# Altium schematic symbol library jlcpcb_2025_04_resistors_extended_2512.schlib: 2667 symbols (part 9 of 14) (continued)
## PE2512FKE7W0R04L
designator R?  Resistance: 40mΩ  (hidden comment: *)
Resistor, 40mΩ, ±1%, 2W, ±50ppm/℃, -55℃~+170℃, SMD 2512; Manufacturer: Uniroyal; Manufacturer Part Number: PE2512FKE7W0R04L; Supplier 1: LCSC; Supplier Part Number 1: C875729; JLCPCB Part Number: C875729; Power Rating: 2W; Category: Resistors; Package Size: 2512; JLCPCB Basic Part: Yes; Tolerance: ±1%; Temperature Coefficient: ±50ppm/℃; Temperature Rating: -55℃~+170℃; ComponentLink1Description: Datasheet; ComponentLink1URL: https://wmsc.lcsc.com/wmsc/upload/file/pdf/v2/lcsc/2104021442_YAGEO-PE2512FKE7W0R04L_C875729.pdf; ComponentLink2Description: JLCPCB Part URL; ComponentLink2URL: https://jlcpcb.com/partdetail/C875729
pins: 1, 2
1 alternate drawing of the same symbol

## PE2512FKE7W0R006L
designator R?  Resistance: 6mΩ  (hidden comment: *)
Resistor, 6mΩ, ±1%, 2W, ±50ppm/℃, -55℃~+170℃, SMD 2512; Manufacturer: Uniroyal; Manufacturer Part Number: PE2512FKE7W0R006L; Supplier 1: LCSC; Supplier Part Number 1: C2075798; JLCPCB Part Number: C2075798; Power Rating: 2W; Category: Resistors; Package Size: 2512; JLCPCB Basic Part: Yes; Tolerance: ±1%; Temperature Coefficient: ±50ppm/℃; Temperature Rating: -55℃~+170℃; ComponentLink1Description: Datasheet; ComponentLink1URL: https://wmsc.lcsc.com/wmsc/upload/file/pdf/v2/lcsc/2311211101_YAGEO-PE2512FKE7W0R006L_C2075798.pdf; ComponentLink2Description: JLCPCB Part URL; ComponentLink2URL: https://jlcpcb.com/partdetail/C2075798
pins: 1, 2
1 alternate drawing of the same symbol

## PE2512FKE7W0R06L
designator R?  Resistance: 60mΩ  (hidden comment: *)
Resistor, 60mΩ, ±1%, 2W, ±50ppm/℃, -55℃~+170℃, SMD 2512; Manufacturer: Uniroyal; Manufacturer Part Number: PE2512FKE7W0R06L; Supplier 1: LCSC; Supplier Part Number 1: C875732; JLCPCB Part Number: C875732; Power Rating: 2W; Category: Resistors; Package Size: 2512; JLCPCB Basic Part: Yes; Tolerance: ±1%; Temperature Coefficient: ±50ppm/℃; Temperature Rating: -55℃~+170℃; ComponentLink1Description: Datasheet; ComponentLink1URL: https://wmsc.lcsc.com/wmsc/upload/file/pdf/v2/lcsc/2311211101_YAGEO-PE2512FKE7W0R06L_C875732.pdf; ComponentLink2Description: JLCPCB Part URL; ComponentLink2URL: https://jlcpcb.com/partdetail/C875732
pins: 1, 2
1 alternate drawing of the same symbol

## PE2512FKE7W0R012L
designator R?  Resistance: 12mΩ  (hidden comment: *)
Resistor, 12mΩ, ±1%, 2W, ±50ppm/℃, -55℃~+170℃, SMD 2512; Manufacturer: Uniroyal; Manufacturer Part Number: PE2512FKE7W0R012L; Supplier 1: LCSC; Supplier Part Number 1: C875718; JLCPCB Part Number: C875718; Power Rating: 2W; Category: Resistors; Package Size: 2512; JLCPCB Basic Part: Yes; Tolerance: ±1%; Temperature Coefficient: ±50ppm/℃; Temperature Rating: -55℃~+170℃; ComponentLink1Description: Datasheet; ComponentLink1URL: https://wmsc.lcsc.com/wmsc/upload/file/pdf/v2/lcsc/2311211101_YAGEO-PE2512FKE7W0R012L_C875718.pdf; ComponentLink2Description: JLCPCB Part URL; ComponentLink2URL: https://jlcpcb.com/partdetail/C875718
pins: 1, 2
1 alternate drawing of the same symbol

## PE2512FKE7W0R018L
designator R?  Resistance: 18mΩ  (hidden comment: *)
Resistor, 18mΩ, ±1%, 2W, ±50ppm/℃, -55℃~+170℃, SMD 2512; Manufacturer: Uniroyal; Manufacturer Part Number: PE2512FKE7W0R018L; Supplier 1: LCSC; Supplier Part Number 1: C875719; JLCPCB Part Number: C875719; Power Rating: 2W; Category: Resistors; Package Size: 2512; JLCPCB Basic Part: Yes; Tolerance: ±1%; Temperature Coefficient: ±50ppm/℃; Temperature Rating: -55℃~+170℃; ComponentLink1Description: Datasheet; ComponentLink1URL: https://wmsc.lcsc.com/wmsc/upload/file/pdf/v2/lcsc/2111120930_YAGEO-PE2512FKE7W0R018L_C875719.pdf; ComponentLink2Description: JLCPCB Part URL; ComponentLink2URL: https://jlcpcb.com/partdetail/C875719
pins: 1, 2
1 alternate drawing of the same symbol

## PE2512FKE070R01L
designator R?  Resistance: 10mΩ  (hidden comment: *)
Resistor, 10mΩ, ±1%, 1W, ±50ppm/℃, -55℃~+170℃, SMD 2512; Manufacturer: Uniroyal; Manufacturer Part Number: PE2512FKE070R01L; Supplier 1: LCSC; Supplier Part Number 1: C2093321; JLCPCB Part Number: C2093321; Power Rating: 1W; Category: Resistors; Package Size: 2512; JLCPCB Basic Part: Yes; Tolerance: ±1%; Temperature Coefficient: ±50ppm/℃; Temperature Rating: -55℃~+170℃; ComponentLink1Description: Datasheet; ComponentLink1URL: https://wmsc.lcsc.com/wmsc/upload/file/pdf/v2/lcsc/2311211101_YAGEO-PE2512FKE070R01L_C2093321.pdf; ComponentLink2Description: JLCPCB Part URL; ComponentLink2URL: https://jlcpcb.com/partdetail/C2093321
pins: 1, 2
1 alternate drawing of the same symbol

## PE2512FKE070R03L
designator R?  Resistance: 30mΩ  (hidden comment: *)
Resistor, 30mΩ, ±1%, 1W, ±50ppm/℃, -55℃~+170℃, SMD 2512; Manufacturer: Uniroyal; Manufacturer Part Number: PE2512FKE070R03L; Supplier 1: LCSC; Supplier Part Number 1: C4139521; JLCPCB Part Number: C4139521; Power Rating: 1W; Category: Resistors; Package Size: 2512; JLCPCB Basic Part: Yes; Tolerance: ±1%; Temperature Coefficient: ±50ppm/℃; Temperature Rating: -55℃~+170℃; ComponentLink1Description: Datasheet; ComponentLink1URL: https://wmsc.lcsc.com/wmsc/upload/file/pdf/v2/lcsc/2311211101_YAGEO-PE2512FKE070R03L_C4139521.pdf; ComponentLink2Description: JLCPCB Part URL; ComponentLink2URL: https://jlcpcb.com/partdetail/C4139521
pins: 1, 2
1 alternate drawing of the same symbol

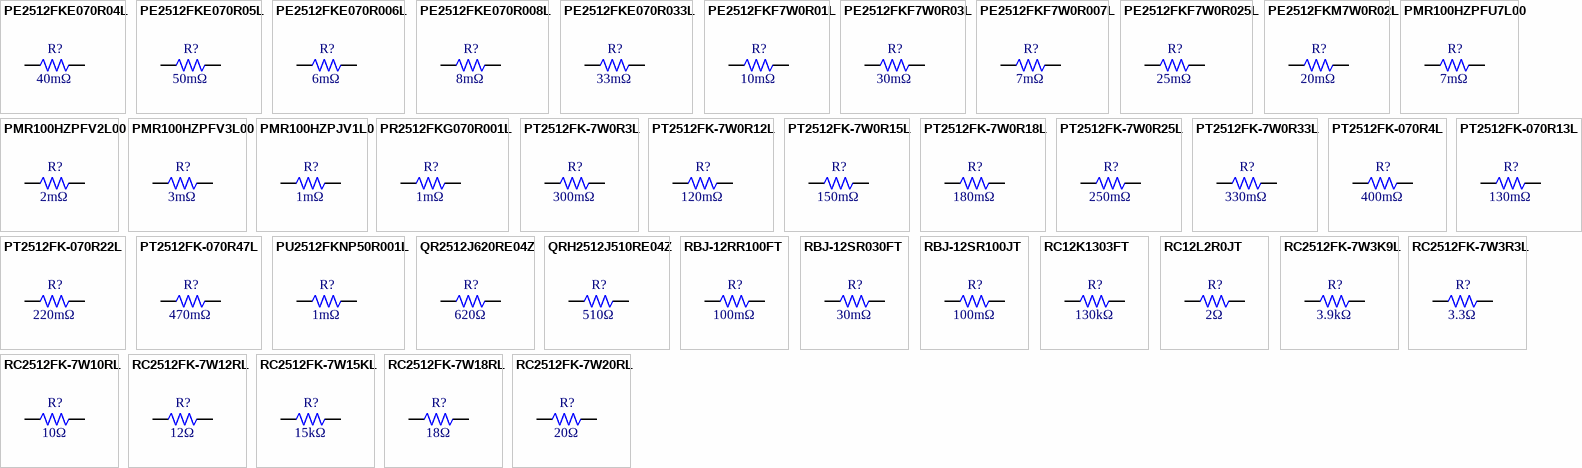
[diagram p41: symbols PE2512FKE070R04L to RC2512FK-7W20RL]

## PE2512FKE070R04L
designator R?  Resistance: 40mΩ  (hidden comment: *)
Resistor, 40mΩ, ±1%, 1W, ±50ppm/℃, -55℃~+170℃, SMD 2512; Manufacturer: Uniroyal; Manufacturer Part Number: PE2512FKE070R04L; Supplier 1: LCSC; Supplier Part Number 1: C2075347; JLCPCB Part Number: C2075347; Power Rating: 1W; Category: Resistors; Package Size: 2512; JLCPCB Basic Part: Yes; Tolerance: ±1%; Temperature Coefficient: ±50ppm/℃; Temperature Rating: -55℃~+170℃; ComponentLink1Description: Datasheet; ComponentLink1URL: https://wmsc.lcsc.com/wmsc/upload/file/pdf/v2/lcsc/2311211101_YAGEO-PE2512FKE070R04L_C2075347.pdf; ComponentLink2Description: JLCPCB Part URL; ComponentLink2URL: https://jlcpcb.com/partdetail/C2075347
pins: 1, 2
1 alternate drawing of the same symbol

## PE2512FKE070R05L
designator R?  Resistance: 50mΩ  (hidden comment: *)
Resistor, 50mΩ, ±1%, 1W, ±50ppm/℃, -55℃~+170℃, SMD 2512; Manufacturer: Uniroyal; Manufacturer Part Number: PE2512FKE070R05L; Supplier 1: LCSC; Supplier Part Number 1: C2073413; JLCPCB Part Number: C2073413; Power Rating: 1W; Category: Resistors; Package Size: 2512; JLCPCB Basic Part: Yes; Tolerance: ±1%; Temperature Coefficient: ±50ppm/℃; Temperature Rating: -55℃~+170℃; ComponentLink1Description: Datasheet; ComponentLink1URL: https://wmsc.lcsc.com/wmsc/upload/file/pdf/v2/lcsc/2311211101_YAGEO-PE2512FKE070R05L_C2073413.pdf; ComponentLink2Description: JLCPCB Part URL; ComponentLink2URL: https://jlcpcb.com/partdetail/C2073413
pins: 1, 2
1 alternate drawing of the same symbol

## PE2512FKE070R006L
designator R?  Resistance: 6mΩ  (hidden comment: *)
Resistor, 6mΩ, ±1%, 1W, ±50ppm/℃, -55℃~+170℃, SMD 2512; Manufacturer: Uniroyal; Manufacturer Part Number: PE2512FKE070R006L; Supplier 1: LCSC; Supplier Part Number 1: C2075576; JLCPCB Part Number: C2075576; Power Rating: 1W; Category: Resistors; Package Size: 2512; JLCPCB Basic Part: Yes; Tolerance: ±1%; Temperature Coefficient: ±50ppm/℃; Temperature Rating: -55℃~+170℃; ComponentLink1Description: Datasheet; ComponentLink1URL: https://wmsc.lcsc.com/wmsc/upload/file/pdf/v2/lcsc/2311211101_YAGEO-PE2512FKE070R006L_C2075576.pdf; ComponentLink2Description: JLCPCB Part URL; ComponentLink2URL: https://jlcpcb.com/partdetail/C2075576
pins: 1, 2
1 alternate drawing of the same symbol

## PE2512FKE070R008L
designator R?  Resistance: 8mΩ  (hidden comment: *)
Resistor, 8mΩ, ±1%, 1W, ±50ppm/℃, -55℃~+170℃, SMD 2512; Manufacturer: Uniroyal; Manufacturer Part Number: PE2512FKE070R008L; Supplier 1: LCSC; Supplier Part Number 1: C2075410; JLCPCB Part Number: C2075410; Power Rating: 1W; Category: Resistors; Package Size: 2512; JLCPCB Basic Part: Yes; Tolerance: ±1%; Temperature Coefficient: ±50ppm/℃; Temperature Rating: -55℃~+170℃; ComponentLink1Description: Datasheet; ComponentLink1URL: https://wmsc.lcsc.com/wmsc/upload/file/pdf/v2/lcsc/2311211101_YAGEO-PE2512FKE070R008L_C2075410.pdf; ComponentLink2Description: JLCPCB Part URL; ComponentLink2URL: https://jlcpcb.com/partdetail/C2075410
pins: 1, 2
1 alternate drawing of the same symbol

## PE2512FKE070R033L
designator R?  Resistance: 33mΩ  (hidden comment: *)
Resistor, 33mΩ, ±1%, 1W, ±50ppm/℃, -55℃~+170℃, SMD 2512; Manufacturer: Uniroyal; Manufacturer Part Number: PE2512FKE070R033L; Supplier 1: LCSC; Supplier Part Number 1: C4191844; JLCPCB Part Number: C4191844; Power Rating: 1W; Category: Resistors; Package Size: 2512; JLCPCB Basic Part: Yes; Tolerance: ±1%; Temperature Coefficient: ±50ppm/℃; Temperature Rating: -55℃~+170℃; ComponentLink1Description: Datasheet; ComponentLink1URL: https://wmsc.lcsc.com/wmsc/upload/file/pdf/v2/lcsc/2311211101_YAGEO-PE2512FKE070R033L_C4191844.pdf; ComponentLink2Description: JLCPCB Part URL; ComponentLink2URL: https://jlcpcb.com/partdetail/C4191844
pins: 1, 2
1 alternate drawing of the same symbol

## PE2512FKF7W0R01L
designator R?  Resistance: 10mΩ  (hidden comment: *)
Resistor, 10mΩ, ±1%, 2W, ±100ppm/℃, -55℃~+170℃, SMD 2512; Manufacturer: Uniroyal; Manufacturer Part Number: PE2512FKF7W0R01L; Supplier 1: LCSC; Supplier Part Number 1: C875763; JLCPCB Part Number: C875763; Power Rating: 2W; Category: Resistors; Package Size: 2512; JLCPCB Basic Part: Yes; Tolerance: ±1%; Temperature Coefficient: ±100ppm/℃; Temperature Rating: -55℃~+170℃; ComponentLink1Description: Datasheet; ComponentLink1URL: https://wmsc.lcsc.com/wmsc/upload/file/pdf/v2/lcsc/2311211101_YAGEO-PE2512FKF7W0R01L_C875763.pdf; ComponentLink2Description: JLCPCB Part URL; ComponentLink2URL: https://jlcpcb.com/partdetail/C875763
pins: 1, 2
1 alternate drawing of the same symbol

## PE2512FKF7W0R03L
designator R?  Resistance: 30mΩ  (hidden comment: *)
Resistor, 30mΩ, ±1%, 2W, ±100ppm/℃, -55℃~+170℃, SMD 2512; Manufacturer: Uniroyal; Manufacturer Part Number: PE2512FKF7W0R03L; Supplier 1: LCSC; Supplier Part Number 1: C875773; JLCPCB Part Number: C875773; Power Rating: 2W; Category: Resistors; Package Size: 2512; JLCPCB Basic Part: Yes; Tolerance: ±1%; Temperature Coefficient: ±100ppm/℃; Temperature Rating: -55℃~+170℃; ComponentLink1Description: Datasheet; ComponentLink1URL: https://wmsc.lcsc.com/wmsc/upload/file/pdf/v2/lcsc/2311211101_YAGEO-PE2512FKF7W0R03L_C875773.pdf; ComponentLink2Description: JLCPCB Part URL; ComponentLink2URL: https://jlcpcb.com/partdetail/C875773
pins: 1, 2
1 alternate drawing of the same symbol

## PE2512FKF7W0R007L
designator R?  Resistance: 7mΩ  (hidden comment: *)
Resistor, 7mΩ, ±1%, 2W, ±100ppm/℃, -55℃~+170℃, SMD 2512; Manufacturer: Uniroyal; Manufacturer Part Number: PE2512FKF7W0R007L; Supplier 1: LCSC; Supplier Part Number 1: C875753; JLCPCB Part Number: C875753; Power Rating: 2W; Category: Resistors; Package Size: 2512; JLCPCB Basic Part: Yes; Tolerance: ±1%; Temperature Coefficient: ±100ppm/℃; Temperature Rating: -55℃~+170℃; ComponentLink1Description: Datasheet; ComponentLink1URL: https://wmsc.lcsc.com/wmsc/upload/file/pdf/v2/lcsc/2311211101_YAGEO-PE2512FKF7W0R007L_C875753.pdf; ComponentLink2Description: JLCPCB Part URL; ComponentLink2URL: https://jlcpcb.com/partdetail/C875753
pins: 1, 2
1 alternate drawing of the same symbol

## PE2512FKF7W0R025L
designator R?  Resistance: 25mΩ  (hidden comment: *)
Resistor, 25mΩ, ±1%, 2W, ±100ppm/℃, -55℃~+170℃, SMD 2512; Manufacturer: Uniroyal; Manufacturer Part Number: PE2512FKF7W0R025L; Supplier 1: LCSC; Supplier Part Number 1: C875765; JLCPCB Part Number: C875765; Power Rating: 2W; Category: Resistors; Package Size: 2512; JLCPCB Basic Part: Yes; Tolerance: ±1%; Temperature Coefficient: ±100ppm/℃; Temperature Rating: -55℃~+170℃; ComponentLink1Description: Datasheet; ComponentLink1URL: https://wmsc.lcsc.com/wmsc/upload/file/pdf/v2/lcsc/2103301636_YAGEO-PE2512FKF7W0R025L_C875765.pdf; ComponentLink2Description: JLCPCB Part URL; ComponentLink2URL: https://jlcpcb.com/partdetail/C875765
pins: 1, 2
1 alternate drawing of the same symbol

## PE2512FKM7W0R02L
designator R?  Resistance: 20mΩ  (hidden comment: *)
Resistor, 20mΩ, ±1%, 2W, ±75ppm/℃, -55℃~+170℃, SMD 2512; Manufacturer: Uniroyal; Manufacturer Part Number: PE2512FKM7W0R02L; Supplier 1: LCSC; Supplier Part Number 1: C875795; JLCPCB Part Number: C875795; Power Rating: 2W; Category: Resistors; Package Size: 2512; JLCPCB Basic Part: Yes; Tolerance: ±1%; Temperature Coefficient: ±75ppm/℃; Temperature Rating: -55℃~+170℃; ComponentLink1Description: Datasheet; ComponentLink1URL: https://wmsc.lcsc.com/wmsc/upload/file/pdf/v2/lcsc/2311211101_YAGEO-PE2512FKM7W0R02L_C875795.pdf; ComponentLink2Description: JLCPCB Part URL; ComponentLink2URL: https://jlcpcb.com/partdetail/C875795
pins: 1, 2
1 alternate drawing of the same symbol

## PMR100HZPFU7L00
designator R?  Resistance: 7mΩ  (hidden comment: *)
Resistor, 7mΩ, ±1%, 2W, ±100ppm/℃, -55℃~+155℃, SMD 2512; Manufacturer: Uniroyal; Manufacturer Part Number: PMR100HZPFU7L00; Supplier 1: LCSC; Supplier Part Number 1: C509728; JLCPCB Part Number: C509728; Power Rating: 2W; Category: Resistors; Package Size: 2512; JLCPCB Basic Part: Yes; Tolerance: ±1%; Temperature Coefficient: ±100ppm/℃; Temperature Rating: -55℃~+155℃; ComponentLink1Description: Datasheet; ComponentLink2Description: JLCPCB Part URL; ComponentLink2URL: https://jlcpcb.com/partdetail/C509728
pins: 1, 2
1 alternate drawing of the same symbol

## PMR100HZPFV2L00
designator R?  Resistance: 2mΩ  (hidden comment: *)
Resistor, 2mΩ, ±1%, 2W, ±150ppm/℃, -55℃~+155℃, SMD 2512; Manufacturer: Uniroyal; Manufacturer Part Number: PMR100HZPFV2L00; Supplier 1: LCSC; Supplier Part Number 1: C509732; JLCPCB Part Number: C509732; Power Rating: 2W; Category: Resistors; Package Size: 2512; JLCPCB Basic Part: Yes; Tolerance: ±1%; Temperature Coefficient: ±150ppm/℃; Temperature Rating: -55℃~+155℃; ComponentLink1Description: Datasheet; ComponentLink1URL: https://wmsc.lcsc.com/wmsc/upload/file/pdf/v2/lcsc/2304140030_ROHM-Semicon-PMR100HZPFV2L00_C509732.pdf; ComponentLink2Description: JLCPCB Part URL; ComponentLink2URL: https://jlcpcb.com/partdetail/C509732
pins: 1, 2
1 alternate drawing of the same symbol

## PMR100HZPFV3L00
designator R?  Resistance: 3mΩ  (hidden comment: *)
Resistor, 3mΩ, ±1%, 2W, ±100ppm/℃, -55℃~+155℃, SMD 2512; Manufacturer: Uniroyal; Manufacturer Part Number: PMR100HZPFV3L00; Supplier 1: LCSC; Supplier Part Number 1: C509733; JLCPCB Part Number: C509733; Power Rating: 2W; Category: Resistors; Package Size: 2512; JLCPCB Basic Part: Yes; Tolerance: ±1%; Temperature Coefficient: ±100ppm/℃; Temperature Rating: -55℃~+155℃; ComponentLink1Description: Datasheet; ComponentLink1URL: https://wmsc.lcsc.com/wmsc/upload/file/pdf/v2/lcsc/2404151036_ROHM-Semicon-PMR100HZPFV3L00_C509733.pdf; ComponentLink2Description: JLCPCB Part URL; ComponentLink2URL: https://jlcpcb.com/partdetail/C509733
pins: 1, 2
1 alternate drawing of the same symbol

## PMR100HZPJV1L0
designator R?  Resistance: 1mΩ  (hidden comment: *)
Resistor, 1mΩ, ±5%, 2W, ±150ppm/℃, -55℃~+155℃, SMD 2512; Manufacturer: Uniroyal; Manufacturer Part Number: PMR100HZPJV1L0; Supplier 1: LCSC; Supplier Part Number 1: C600864; JLCPCB Part Number: C600864; Power Rating: 2W; Category: Resistors; Package Size: 2512; JLCPCB Basic Part: Yes; Tolerance: ±5%; Temperature Coefficient: ±150ppm/℃; Temperature Rating: -55℃~+155℃; ComponentLink1Description: Datasheet; ComponentLink1URL: https://wmsc.lcsc.com/wmsc/upload/file/pdf/v2/lcsc/2006151335_ROHM-Semicon-PMR100HZPJV1L0_C600864.pdf; ComponentLink2Description: JLCPCB Part URL; ComponentLink2URL: https://jlcpcb.com/partdetail/C600864
pins: 1, 2
1 alternate drawing of the same symbol

## PR2512FKG070R001L
designator R?  Resistance: 1mΩ  (hidden comment: *)
Resistor, 1mΩ, ±1%, ±200ppm/℃, SMD 2512; Manufacturer: Uniroyal; Manufacturer Part Number: PR2512FKG070R001L; Supplier 1: LCSC; Supplier Part Number 1: C2930555; JLCPCB Part Number: C2930555; Category: Resistors; Package Size: 2512; JLCPCB Basic Part: Yes; Tolerance: ±1%; Temperature Coefficient: ±200ppm/℃; ComponentLink1Description: Datasheet; ComponentLink2Description: JLCPCB Part URL; ComponentLink2URL: https://jlcpcb.com/partdetail/C2930555
pins: 1, 2
1 alternate drawing of the same symbol

## PT2512FK-7W0R3L
designator R?  Resistance: 300mΩ  (hidden comment: *)
Resistor, 300mΩ, ±1%, 2W, ±75ppm/℃, -55℃~+155℃, SMD 2512; Manufacturer: Uniroyal; Manufacturer Part Number: PT2512FK-7W0R3L; Supplier 1: LCSC; Supplier Part Number 1: C875888; JLCPCB Part Number: C875888; Power Rating: 2W; Category: Resistors; Package Size: 2512; JLCPCB Basic Part: Yes; Tolerance: ±1%; Temperature Coefficient: ±75ppm/℃; Temperature Rating: -55℃~+155℃; ComponentLink1Description: Datasheet; ComponentLink1URL: https://wmsc.lcsc.com/wmsc/upload/file/pdf/v2/lcsc/2210201630_YAGEO-PT2512FK-7W0R3L_C875888.pdf; ComponentLink2Description: JLCPCB Part URL; ComponentLink2URL: https://jlcpcb.com/partdetail/C875888
pins: 1, 2
1 alternate drawing of the same symbol

## PT2512FK-7W0R12L
designator R?  Resistance: 120mΩ  (hidden comment: *)
Resistor, 120mΩ, ±1%, 2W, ±75ppm/℃, -55℃~+155℃, SMD 2512; Manufacturer: Uniroyal; Manufacturer Part Number: PT2512FK-7W0R12L; Supplier 1: LCSC; Supplier Part Number 1: C875871; JLCPCB Part Number: C875871; Power Rating: 2W; Category: Resistors; Package Size: 2512; JLCPCB Basic Part: Yes; Tolerance: ±1%; Temperature Coefficient: ±75ppm/℃; Temperature Rating: -55℃~+155℃; ComponentLink1Description: Datasheet; ComponentLink1URL: https://wmsc.lcsc.com/wmsc/upload/file/pdf/v2/lcsc/2203031730_YAGEO-PT2512FK-7W0R12L_C875871.pdf; ComponentLink2Description: JLCPCB Part URL; ComponentLink2URL: https://jlcpcb.com/partdetail/C875871
pins: 1, 2
1 alternate drawing of the same symbol

## PT2512FK-7W0R15L
designator R?  Resistance: 150mΩ  (hidden comment: *)
Resistor, 150mΩ, ±1%, 2W, ±75ppm/℃, -55℃~+155℃, SMD 2512; Manufacturer: Uniroyal; Manufacturer Part Number: PT2512FK-7W0R15L; Supplier 1: LCSC; Supplier Part Number 1: C723473; JLCPCB Part Number: C723473; Power Rating: 2W; Category: Resistors; Package Size: 2512; JLCPCB Basic Part: Yes; Tolerance: ±1%; Temperature Coefficient: ±75ppm/℃; Temperature Rating: -55℃~+155℃; ComponentLink1Description: Datasheet; ComponentLink1URL: https://wmsc.lcsc.com/wmsc/upload/file/pdf/v2/lcsc/2305242230_YAGEO-PT2512FK-7W0R15L_C723473.pdf; ComponentLink2Description: JLCPCB Part URL; ComponentLink2URL: https://jlcpcb.com/partdetail/C723473
pins: 1, 2
1 alternate drawing of the same symbol

## PT2512FK-7W0R18L
designator R?  Resistance: 180mΩ  (hidden comment: *)
Resistor, 180mΩ, ±1%, 2W, ±75ppm/℃, -55℃~+155℃, SMD 2512; Manufacturer: Uniroyal; Manufacturer Part Number: PT2512FK-7W0R18L; Supplier 1: LCSC; Supplier Part Number 1: C326559; JLCPCB Part Number: C326559; Power Rating: 2W; Category: Resistors; Package Size: 2512; JLCPCB Basic Part: Yes; Tolerance: ±1%; Temperature Coefficient: ±75ppm/℃; Temperature Rating: -55℃~+155℃; ComponentLink1Description: Datasheet; ComponentLink1URL: https://wmsc.lcsc.com/wmsc/upload/file/pdf/v2/lcsc/1811141451_YAGEO-PT2512FK-7W0R18L_C326559.pdf; ComponentLink2Description: JLCPCB Part URL; ComponentLink2URL: https://jlcpcb.com/partdetail/C326559
pins: 1, 2
1 alternate drawing of the same symbol

## PT2512FK-7W0R25L
designator R?  Resistance: 250mΩ  (hidden comment: *)
Resistor, 250mΩ, ±1%, 2W, ±75ppm/℃, -55℃~+155℃, SMD 2512; Manufacturer: Uniroyal; Manufacturer Part Number: PT2512FK-7W0R25L; Supplier 1: LCSC; Supplier Part Number 1: C875877; JLCPCB Part Number: C875877; Power Rating: 2W; Category: Resistors; Package Size: 2512; JLCPCB Basic Part: Yes; Tolerance: ±1%; Temperature Coefficient: ±75ppm/℃; Temperature Rating: -55℃~+155℃; ComponentLink1Description: Datasheet; ComponentLink1URL: https://wmsc.lcsc.com/wmsc/upload/file/pdf/v2/lcsc/2112151030_YAGEO-PT2512FK-7W0R25L_C875877.pdf; ComponentLink2Description: JLCPCB Part URL; ComponentLink2URL: https://jlcpcb.com/partdetail/C875877
pins: 1, 2
1 alternate drawing of the same symbol

## PT2512FK-7W0R33L
designator R?  Resistance: 330mΩ  (hidden comment: *)
Resistor, 330mΩ, ±1%, 2W, ±75ppm/℃, -55℃~+155℃, SMD 2512; Manufacturer: Uniroyal; Manufacturer Part Number: PT2512FK-7W0R33L; Supplier 1: LCSC; Supplier Part Number 1: C875883; JLCPCB Part Number: C875883; Power Rating: 2W; Category: Resistors; Package Size: 2512; JLCPCB Basic Part: Yes; Tolerance: ±1%; Temperature Coefficient: ±75ppm/℃; Temperature Rating: -55℃~+155℃; ComponentLink1Description: Datasheet; ComponentLink1URL: https://wmsc.lcsc.com/wmsc/upload/file/pdf/v2/lcsc/2210201630_YAGEO-PT2512FK-7W0R33L_C875883.pdf; ComponentLink2Description: JLCPCB Part URL; ComponentLink2URL: https://jlcpcb.com/partdetail/C875883
pins: 1, 2
1 alternate drawing of the same symbol

## PT2512FK-070R4L
designator R?  Resistance: 400mΩ  (hidden comment: *)
Resistor, 400mΩ, ±1%, 1W, ±75ppm/℃, -55℃~+155℃, SMD 2512; Manufacturer: Uniroyal; Manufacturer Part Number: PT2512FK-070R4L; Supplier 1: LCSC; Supplier Part Number 1: C875856; JLCPCB Part Number: C875856; Power Rating: 1W; Category: Resistors; Package Size: 2512; JLCPCB Basic Part: Yes; Tolerance: ±1%; Temperature Coefficient: ±75ppm/℃; Temperature Rating: -55℃~+155℃; ComponentLink1Description: Datasheet; ComponentLink1URL: https://wmsc.lcsc.com/wmsc/upload/file/pdf/v2/lcsc/2311211101_YAGEO-PT2512FK-070R4L_C875856.pdf; ComponentLink2Description: JLCPCB Part URL; ComponentLink2URL: https://jlcpcb.com/partdetail/C875856
pins: 1, 2
1 alternate drawing of the same symbol

## PT2512FK-070R13L
designator R?  Resistance: 130mΩ  (hidden comment: *)
Resistor, 130mΩ, ±1%, 1W, ±75ppm/℃, -55℃~+155℃, SMD 2512; Manufacturer: Uniroyal; Manufacturer Part Number: PT2512FK-070R13L; Supplier 1: LCSC; Supplier Part Number 1: C875831; JLCPCB Part Number: C875831; Power Rating: 1W; Category: Resistors; Package Size: 2512; JLCPCB Basic Part: Yes; Tolerance: ±1%; Temperature Coefficient: ±75ppm/℃; Temperature Rating: -55℃~+155℃; ComponentLink1Description: Datasheet; ComponentLink1URL: https://wmsc.lcsc.com/wmsc/upload/file/pdf/v2/lcsc/2210201630_YAGEO-PT2512FK-070R13L_C875831.pdf; ComponentLink2Description: JLCPCB Part URL; ComponentLink2URL: https://jlcpcb.com/partdetail/C875831
pins: 1, 2
1 alternate drawing of the same symbol

## PT2512FK-070R22L
designator R?  Resistance: 220mΩ  (hidden comment: *)
Resistor, 220mΩ, ±1%, 1W, ±75ppm/℃, -55℃~+155℃, SMD 2512; Manufacturer: Uniroyal; Manufacturer Part Number: PT2512FK-070R22L; Supplier 1: LCSC; Supplier Part Number 1: C875839; JLCPCB Part Number: C875839; Power Rating: 1W; Category: Resistors; Package Size: 2512; JLCPCB Basic Part: Yes; Tolerance: ±1%; Temperature Coefficient: ±75ppm/℃; Temperature Rating: -55℃~+155℃; ComponentLink1Description: Datasheet; ComponentLink1URL: https://wmsc.lcsc.com/wmsc/upload/file/pdf/v2/lcsc/2311211101_YAGEO-PT2512FK-070R22L_C875839.pdf; ComponentLink2Description: JLCPCB Part URL; ComponentLink2URL: https://jlcpcb.com/partdetail/C875839
pins: 1, 2
1 alternate drawing of the same symbol

## PT2512FK-070R47L
designator R?  Resistance: 470mΩ  (hidden comment: *)
Resistor, 470mΩ, ±1%, 1W, ±75ppm/℃, -55℃~+155℃, SMD 2512; Manufacturer: Uniroyal; Manufacturer Part Number: PT2512FK-070R47L; Supplier 1: LCSC; Supplier Part Number 1: C875855; JLCPCB Part Number: C875855; Power Rating: 1W; Category: Resistors; Package Size: 2512; JLCPCB Basic Part: Yes; Tolerance: ±1%; Temperature Coefficient: ±75ppm/℃; Temperature Rating: -55℃~+155℃; ComponentLink1Description: Datasheet; ComponentLink1URL: https://wmsc.lcsc.com/wmsc/upload/file/pdf/v2/lcsc/2201242130_YAGEO-PT2512FK-070R47L_C875855.pdf; ComponentLink2Description: JLCPCB Part URL; ComponentLink2URL: https://jlcpcb.com/partdetail/C875855
pins: 1, 2
1 alternate drawing of the same symbol

## PU2512FKNP50R001L
designator R?  Resistance: 1mΩ  (hidden comment: *)
Resistor, 1mΩ, ±1%, 5W, ±175ppm/℃, -65℃~+170℃, SMD 2512; Manufacturer: Uniroyal; Manufacturer Part Number: PU2512FKNP50R001L; Supplier 1: LCSC; Supplier Part Number 1: C4146794; JLCPCB Part Number: C4146794; Power Rating: 5W; Category: Resistors; Package Size: 2512; JLCPCB Basic Part: Yes; Tolerance: ±1%; Temperature Coefficient: ±175ppm/℃; Temperature Rating: -65℃~+170℃; ComponentLink1Description: Datasheet; ComponentLink1URL: https://wmsc.lcsc.com/wmsc/upload/file/pdf/v2/lcsc/2311271023_YAGEO-PU2512FKNP50R001L_C4146794.pdf; ComponentLink2Description: JLCPCB Part URL; ComponentLink2URL: https://jlcpcb.com/partdetail/C4146794
pins: 1, 2
1 alternate drawing of the same symbol

## QR2512J620RE04Z
designator R?  Resistance: 620Ω  (hidden comment: *)
Resistor, 620Ω, ±5%, 1W, 200V, ±100ppm/℃, -55℃~+155℃, SMD 2512; Manufacturer: Uniroyal; Manufacturer Part Number: QR2512J620RE04Z; Supplier 1: LCSC; Supplier Part Number 1: C176279; JLCPCB Part Number: C176279; Power Rating: 1W; Category: Resistors; Package Size: 2512; JLCPCB Basic Part: Yes; Tolerance: ±5%; Voltage Rating: 200V; Temperature Coefficient: ±100ppm/℃; Temperature Rating: -55℃~+155℃; ComponentLink1Description: Datasheet; ComponentLink1URL: https://wmsc.lcsc.com/wmsc/upload/file/pdf/v2/lcsc/2304140030_Ever-Ohms-Tech-QR2512J620RE04Z_C176279.pdf; ComponentLink2Description: JLCPCB Part URL; ComponentLink2URL: https://jlcpcb.com/partdetail/C176279
pins: 1, 2
1 alternate drawing of the same symbol

## QRH2512J510RE04Z
designator R?  Resistance: 510Ω  (hidden comment: *)
Resistor, 510Ω, ±5%, 2W, 200V, ±100ppm/℃, -55℃~+155℃, SMD 2512; Manufacturer: Uniroyal; Manufacturer Part Number: QRH2512J510RE04Z; Supplier 1: LCSC; Supplier Part Number 1: C176278; JLCPCB Part Number: C176278; Power Rating: 2W; Category: Resistors; Package Size: 2512; JLCPCB Basic Part: Yes; Tolerance: ±5%; Voltage Rating: 200V; Temperature Coefficient: ±100ppm/℃; Temperature Rating: -55℃~+155℃; ComponentLink1Description: Datasheet; ComponentLink1URL: https://wmsc.lcsc.com/wmsc/upload/file/pdf/v2/lcsc/1811141150_Ever-Ohms-Tech-QRH2512J510RE04Z_C176278.pdf; ComponentLink2Description: JLCPCB Part URL; ComponentLink2URL: https://jlcpcb.com/partdetail/C176278
pins: 1, 2
1 alternate drawing of the same symbol

## RBJ-12RR100FT
designator R?  Resistance: 100mΩ  (hidden comment: *)
Resistor, 100mΩ, ±1%, 1W, ±700ppm/℃, SMD 2512; Manufacturer: Uniroyal; Manufacturer Part Number: RBJ-12RR100FT; Supplier 1: LCSC; Supplier Part Number 1: C880419; JLCPCB Part Number: C880419; Power Rating: 1W; Category: Resistors; Package Size: 2512; JLCPCB Basic Part: Yes; Tolerance: ±1%; Temperature Coefficient: ±700ppm/℃; ComponentLink1Description: Datasheet; ComponentLink1URL: https://wmsc.lcsc.com/wmsc/upload/file/pdf/v2/lcsc/2011031039_FH--Guangdong-Fenghua-Advanced-Tech-RBJ-12RR100FT_C880419.pdf; ComponentLink2Description: JLCPCB Part URL; ComponentLink2URL: https://jlcpcb.com/partdetail/C880419
pins: 1, 2
1 alternate drawing of the same symbol

## RBJ-12SR030FT
designator R?  Resistance: 30mΩ  (hidden comment: *)
Resistor, 30mΩ, ±1%, 1W, ±1000ppm/℃, SMD 2512; Manufacturer: Uniroyal; Manufacturer Part Number: RBJ-12SR030FT; Supplier 1: LCSC; Supplier Part Number 1: C880380; JLCPCB Part Number: C880380; Power Rating: 1W; Category: Resistors; Package Size: 2512; JLCPCB Basic Part: Yes; Tolerance: ±1%; Temperature Coefficient: ±1000ppm/℃; ComponentLink1Description: Datasheet; ComponentLink1URL: https://wmsc.lcsc.com/wmsc/upload/file/pdf/v2/lcsc/2011031039_FH--Guangdong-Fenghua-Advanced-Tech-RBJ-12SR030FT_C880380.pdf; ComponentLink2Description: JLCPCB Part URL; ComponentLink2URL: https://jlcpcb.com/partdetail/C880380
pins: 1, 2
1 alternate drawing of the same symbol

## RBJ-12SR100JT
designator R?  Resistance: 100mΩ  (hidden comment: *)
Resistor, 100mΩ, ±5%, 1W, ±1000ppm/℃, SMD 2512; Manufacturer: Uniroyal; Manufacturer Part Number: RBJ-12SR100JT; Supplier 1: LCSC; Supplier Part Number 1: C2961556; JLCPCB Part Number: C2961556; Power Rating: 1W; Category: Resistors; Package Size: 2512; JLCPCB Basic Part: Yes; Tolerance: ±5%; Temperature Coefficient: ±1000ppm/℃; ComponentLink1Description: Datasheet; ComponentLink1URL: https://wmsc.lcsc.com/wmsc/upload/file/pdf/v2/lcsc/2202281730_FH--Guangdong-Fenghua-Advanced-Tech-RBJ-12SR100JT_C2961556.pdf; ComponentLink2Description: JLCPCB Part URL; ComponentLink2URL: https://jlcpcb.com/partdetail/C2961556
pins: 1, 2
1 alternate drawing of the same symbol

## RC12K1303FT
designator R?  Resistance: 130kΩ  (hidden comment: *)
Resistor, 130kΩ, ±1%, 1W, 200V, ±100ppm/℃, -55℃~+155℃, SMD 2512; Manufacturer: Uniroyal; Manufacturer Part Number: RC12K1303FT; Supplier 1: LCSC; Supplier Part Number 1: C1322439; JLCPCB Part Number: C1322439; Power Rating: 1W; Category: Resistors; Package Size: 2512; JLCPCB Basic Part: Yes; Tolerance: ±1%; Voltage Rating: 200V; Temperature Coefficient: ±100ppm/℃; Temperature Rating: -55℃~+155℃; ComponentLink1Description: Datasheet; ComponentLink2Description: JLCPCB Part URL; ComponentLink2URL: https://jlcpcb.com/partdetail/C1322439
pins: 1, 2
1 alternate drawing of the same symbol

## RC12L2R0JT
designator R?  Resistance: 2Ω  (hidden comment: *)
Resistor, 2Ω, ±5%, 1W, 200V, ±250ppm/℃, -55℃~+155℃, SMD 2512; Manufacturer: Uniroyal; Manufacturer Part Number: RC12L2R0JT; Supplier 1: LCSC; Supplier Part Number 1: C1322443; JLCPCB Part Number: C1322443; Power Rating: 1W; Category: Resistors; Package Size: 2512; JLCPCB Basic Part: Yes; Tolerance: ±5%; Voltage Rating: 200V; Temperature Coefficient: ±250ppm/℃; Temperature Rating: -55℃~+155℃; ComponentLink1Description: Datasheet; ComponentLink1URL: https://wmsc.lcsc.com/wmsc/upload/file/pdf/v2/lcsc/2304140030_FH--Guangdong-Fenghua-Advanced-Tech-RC12L2R0JT_C1322443.pdf; ComponentLink2Description: JLCPCB Part URL; ComponentLink2URL: https://jlcpcb.com/partdetail/C1322443
pins: 1, 2
1 alternate drawing of the same symbol

## RC2512FK-7W3K9L
designator R?  Resistance: 3.9kΩ  (hidden comment: *)
Resistor, 3.9kΩ, ±1%, 2W, ±100ppm/℃, -55℃~+155℃, SMD 2512; Manufacturer: Uniroyal; Manufacturer Part Number: RC2512FK-7W3K9L; Supplier 1: LCSC; Supplier Part Number 1: C723442; JLCPCB Part Number: C723442; Power Rating: 2W; Category: Resistors; Package Size: 2512; JLCPCB Basic Part: Yes; Tolerance: ±1%; Temperature Coefficient: ±100ppm/℃; Temperature Rating: -55℃~+155℃; ComponentLink1Description: Datasheet; ComponentLink1URL: https://wmsc.lcsc.com/wmsc/upload/file/pdf/v2/lcsc/2008171306_YAGEO-RC2512FK-7W3K9L_C723442.pdf; ComponentLink2Description: JLCPCB Part URL; ComponentLink2URL: https://jlcpcb.com/partdetail/C723442
pins: 1, 2
1 alternate drawing of the same symbol

## RC2512FK-7W3R3L
designator R?  Resistance: 3.3Ω  (hidden comment: *)
Resistor, 3.3Ω, ±1%, 2W, ±200ppm/℃, -55℃~+155℃, SMD 2512; Manufacturer: Uniroyal; Manufacturer Part Number: RC2512FK-7W3R3L; Supplier 1: LCSC; Supplier Part Number 1: C7337041; JLCPCB Part Number: C7337041; Power Rating: 2W; Category: Resistors; Package Size: 2512; JLCPCB Basic Part: Yes; Tolerance: ±1%; Temperature Coefficient: ±200ppm/℃; Temperature Rating: -55℃~+155℃; ComponentLink1Description: Datasheet; ComponentLink1URL: https://wmsc.lcsc.com/wmsc/upload/file/pdf/v2/lcsc/2312272220_YAGEO-RC2512FK-7W3R3L_C7337041.pdf; ComponentLink2Description: JLCPCB Part URL; ComponentLink2URL: https://jlcpcb.com/partdetail/C7337041
pins: 1, 2
1 alternate drawing of the same symbol

## RC2512FK-7W10RL
designator R?  Resistance: 10Ω  (hidden comment: *)
Resistor, 10Ω, ±1%, 2W, 200V, ±200ppm/℃, -55℃~+155℃, SMD 2512; Manufacturer: Uniroyal; Manufacturer Part Number: RC2512FK-7W10RL; Supplier 1: LCSC; Supplier Part Number 1: C876258; JLCPCB Part Number: C876258; Power Rating: 2W; Category: Resistors; Package Size: 2512; JLCPCB Basic Part: Yes; Tolerance: ±1%; Voltage Rating: 200V; Temperature Coefficient: ±200ppm/℃; Temperature Rating: -55℃~+155℃; ComponentLink1Description: Datasheet; ComponentLink1URL: https://wmsc.lcsc.com/wmsc/upload/file/pdf/v2/lcsc/2201242130_YAGEO-RC2512FK-7W10RL_C876258.pdf; ComponentLink2Description: JLCPCB Part URL; ComponentLink2URL: https://jlcpcb.com/partdetail/C876258
pins: 1, 2
1 alternate drawing of the same symbol

## RC2512FK-7W12RL
designator R?  Resistance: 12Ω  (hidden comment: *)
Resistor, 12Ω, ±1%, 2W, ±200ppm/℃, -55℃~+155℃, SMD 2512; Manufacturer: Uniroyal; Manufacturer Part Number: RC2512FK-7W12RL; Supplier 1: LCSC; Supplier Part Number 1: C5355394; JLCPCB Part Number: C5355394; Power Rating: 2W; Category: Resistors; Package Size: 2512; JLCPCB Basic Part: Yes; Tolerance: ±1%; Temperature Coefficient: ±200ppm/℃; Temperature Rating: -55℃~+155℃; ComponentLink1Description: Datasheet; ComponentLink1URL: https://wmsc.lcsc.com/wmsc/upload/file/pdf/v2/lcsc/2302061809_YAGEO-RC2512FK-7W12RL_C5355394.pdf; ComponentLink2Description: JLCPCB Part URL; ComponentLink2URL: https://jlcpcb.com/partdetail/C5355394
pins: 1, 2
1 alternate drawing of the same symbol

## RC2512FK-7W15KL
designator R?  Resistance: 15kΩ  (hidden comment: *)
Resistor, 15kΩ, ±1%, 2W, 200V, ±200ppm/℃, -55℃~+155℃, SMD 2512; Manufacturer: Uniroyal; Manufacturer Part Number: RC2512FK-7W15KL; Supplier 1: LCSC; Supplier Part Number 1: C914850; JLCPCB Part Number: C914850; Power Rating: 2W; Category: Resistors; Package Size: 2512; JLCPCB Basic Part: Yes; Tolerance: ±1%; Voltage Rating: 200V; Temperature Coefficient: ±200ppm/℃; Temperature Rating: -55℃~+155℃; ComponentLink1Description: Datasheet; ComponentLink1URL: https://wmsc.lcsc.com/wmsc/upload/file/pdf/v2/lcsc/2011202108_YAGEO-RC2512FK-7W15KL_C914850.pdf; ComponentLink2Description: JLCPCB Part URL; ComponentLink2URL: https://jlcpcb.com/partdetail/C914850
pins: 1, 2
1 alternate drawing of the same symbol

## RC2512FK-7W18RL
designator R?  Resistance: 18Ω  (hidden comment: *)
Resistor, 18Ω, ±1%, 2W, 200V, ±200ppm/℃, -55℃~+155℃, SMD 2512; Manufacturer: Uniroyal; Manufacturer Part Number: RC2512FK-7W18RL; Supplier 1: LCSC; Supplier Part Number 1: C914851; JLCPCB Part Number: C914851; Power Rating: 2W; Category: Resistors; Package Size: 2512; JLCPCB Basic Part: Yes; Tolerance: ±1%; Voltage Rating: 200V; Temperature Coefficient: ±200ppm/℃; Temperature Rating: -55℃~+155℃; ComponentLink1Description: Datasheet; ComponentLink1URL: https://wmsc.lcsc.com/wmsc/upload/file/pdf/v2/lcsc/2011202109_YAGEO-RC2512FK-7W18RL_C914851.pdf; ComponentLink2Description: JLCPCB Part URL; ComponentLink2URL: https://jlcpcb.com/partdetail/C914851
pins: 1, 2
1 alternate drawing of the same symbol

## RC2512FK-7W20RL
designator R?  Resistance: 20Ω  (hidden comment: *)
Resistor, 20Ω, ±1%, 2W, 200V, ±200ppm/℃, -55℃~+155℃, SMD 2512; Manufacturer: Uniroyal; Manufacturer Part Number: RC2512FK-7W20RL; Supplier 1: LCSC; Supplier Part Number 1: C2936637; JLCPCB Part Number: C2936637; Power Rating: 2W; Category: Resistors; Package Size: 2512; JLCPCB Basic Part: Yes; Tolerance: ±1%; Voltage Rating: 200V; Temperature Coefficient: ±200ppm/℃; Temperature Rating: -55℃~+155℃; ComponentLink1Description: Datasheet; ComponentLink1URL: https://wmsc.lcsc.com/wmsc/upload/file/pdf/v2/lcsc/2201121730_YAGEO-RC2512FK-7W20RL_C2936637.pdf; ComponentLink2Description: JLCPCB Part URL; ComponentLink2URL: https://jlcpcb.com/partdetail/C2936637
pins: 1, 2
1 alternate drawing of the same symbol

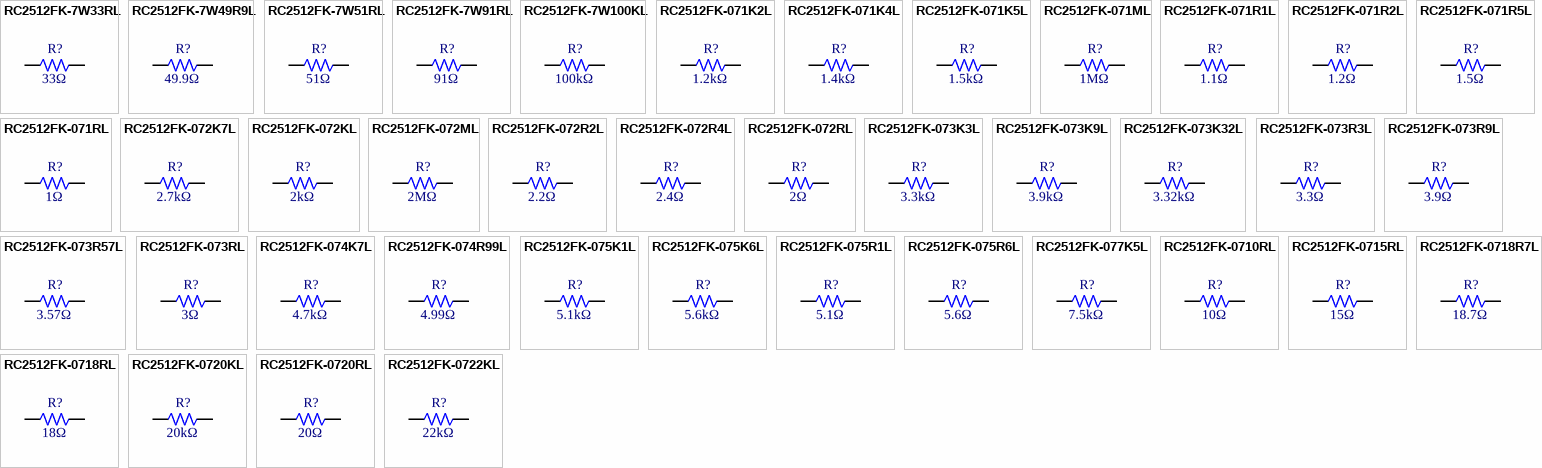
[diagram p42: symbols RC2512FK-7W33RL to RC2512FK-0722KL]
